# Altium schematic symbol library Capacitor - Aluminium TH.SchLib: 4591 symbols (part 20 of 27) (continued)
## UPJ1V102MHD (continued)
CAP ALUM 1000UF 20% 35V RADIAL; Part Number: UPJ1V102MHD; Manufacturer: Nichicon; TemperatureRange: -55C ~ 105C; Type: Polar; Ripple Current: 1.71A; Impedance: 35 mOhm; Value: 1000uF; PartId: 24222; Supplier 1: Digi-Key; Supplier Part Number 1: 493-11098-ND; ComponentLink1Description: Datasheet; ComponentLink1URL: http://nichicon-us.com/english/products/pdfs/e-upj.pdf; ComponentLink2Description: Digi-Key Listing; ComponentLink2URL: https://www.digikey.com/product-detail/en/nichicon/UPJ1V102MHD/493-11098-ND/2599303; Tolerance: 20%; Voltage: 35V; Price: 0.96; Device Package: Radial, Can, 12.5mm
footprint CAP AL TH D12.5 L5 H35.5
pins: 1, 2

## UPJ1V102MHD6TN
designator C?, comment 1000uF  (value not drawn)
CAP ALUM 1000UF 20% 35V RADIAL; Part Number: UPJ1V102MHD6TN; Manufacturer: Nichicon; TemperatureRange: -55C ~ 105C; Type: Polar; Ripple Current: 1.53A @ 120Hz; Impedance: 50 mOhm; Value: 1000uF; PartId: 26368; Supplier 1: Digi-Key; Supplier Part Number 1: 493-12242-3-ND; ComponentLink1Description: Datasheet; ComponentLink1URL: http://nichicon-us.com/english/products/pdfs/e-upj.pdf; ComponentLink2Description: Digi-Key Listing; ComponentLink2URL: https://www.digikey.com/product-detail/en/nichicon/UPJ1V102MHD6TN/493-12242-3-ND/4321385; Tolerance: 20%; Voltage: 35V; Price: 0.5706; Device Package: Radial, Can, 16mm
footprint CAP AL TH D16 L7.5 H22
pins: 1, 2

## UPJ1V121MPD6TD
designator C?, comment 120uF  (value not drawn)
CAP ALUM 120UF 20% 35V RADIAL; Part Number: UPJ1V121MPD6TD; Manufacturer: Nichicon; TemperatureRange: -55C ~ 105C; Type: Polar; Ripple Current: 375mA @ 120Hz; Impedance: 240 mOhm; Value: 120uF; PartId: 24773; Supplier 1: Digi-Key; Supplier Part Number 1: 493-11651-1-ND; ComponentLink1Description: Datasheet; ComponentLink1URL: http://nichicon-us.com/english/products/pdfs/e-upj.pdf; ComponentLink2Description: Digi-Key Listing; ComponentLink2URL: https://www.digikey.com/product-detail/en/nichicon/UPJ1V121MPD6TD/493-11651-1-ND/4319488; Tolerance: 20%; Voltage: 35V; Price: 0.43; Device Package: Radial, Can, 10mm
footprint CAP AL TH D10 L5 H14.5
pins: 1, 2

## UPJ1V151MPD6TD
designator C?, comment 150uF  (value not drawn)
CAP ALUM 150UF 20% 35V RADIAL; Part Number: UPJ1V151MPD6TD; Manufacturer: Nichicon; TemperatureRange: -55C ~ 105C; Type: Polar; Ripple Current: 435mA @ 120Hz; Impedance: 200 mOhm; Value: 150uF; PartId: 24868; Supplier 1: Digi-Key; Supplier Part Number 1: 493-11683-1-ND; ComponentLink1Description: Datasheet; ComponentLink1URL: http://nichicon-us.com/english/products/pdfs/e-upj.pdf; ComponentLink2Description: Digi-Key Listing; ComponentLink2URL: https://www.digikey.com/product-detail/en/nichicon/UPJ1V151MPD6TD/493-11683-1-ND/4319490; Tolerance: 20%; Voltage: 35V; Price: 0.47; Device Package: Radial, Can, 10mm
footprint CAP AL TH D10 L5 H14.5
pins: 1, 2

## UPJ1V181MPD6TD
designator C?, comment 180uF  (value not drawn)
CAP ALUM 180UF 20% 35V RADIAL; Part Number: UPJ1V181MPD6TD; Manufacturer: Nichicon; TemperatureRange: -55C ~ 105C; Type: Polar; Ripple Current: 500mA @ 120Hz; Impedance: 180 mOhm; Value: 180uF; PartId: 24998; Supplier 1: Digi-Key; Supplier Part Number 1: 493-5112-3-ND; ComponentLink1Description: Datasheet; ComponentLink1URL: http://nichicon-us.com/english/products/pdfs/e-upj.pdf; ComponentLink2Description: Digi-Key Listing; ComponentLink2URL: https://www.digikey.com/product-detail/en/nichicon/UPJ1V181MPD6TD/493-5112-3-ND/3130117; Tolerance: 20%; Voltage: 35V; Price: 0.1467; Device Package: Radial, Can, 10mm
footprint CAP AL TH D10 L5 H17.5
pins: 1, 2

## UPJ1V182MHD
designator C?, comment 1800uF  (value not drawn)
CAP ALUM 1800UF 20% 35V RADIAL; Part Number: UPJ1V182MHD; Manufacturer: Nichicon; TemperatureRange: -55C ~ 105C; Type: Polar; Ripple Current: 2.22A @ 120Hz; Impedance: 27 mOhm; Value: 1800uF; PartId: 27009; Supplier 1: Digi-Key; Supplier Part Number 1: 493-5560-ND; ComponentLink1Description: Datasheet; ComponentLink1URL: http://nichicon-us.com/english/products/pdfs/e-upj.pdf; ComponentLink2Description: Digi-Key Listing; ComponentLink2URL: https://www.digikey.com/product-detail/en/nichicon/UPJ1V182MHD/493-5560-ND/2599315; Tolerance: 20%; Voltage: 35V; Price: 1.4; Device Package: Radial, Can, 16mm
footprint CAP AL TH D16 L7.5 H33.5
pins: 1, 2

## UPJ1V221MPD6
designator C?, comment 220uF  (value not drawn)
CAP ALUM 220UF 20% 35V RADIAL; Part Number: UPJ1V221MPD6; Manufacturer: Nichicon; TemperatureRange: -55C ~ 105C; Type: Polar; Ripple Current: 560mA @ 120Hz; Impedance: 140 mOhm; Value: 220uF; PartId: 25182; Supplier 1: Digi-Key; Supplier Part Number 1: UPJ1V221MPD6-ND; ComponentLink1Description: Datasheet; ComponentLink1URL: http://nichicon-us.com/english/products/pdfs/e-upj.pdf; ComponentLink2Description: Digi-Key Listing; ComponentLink2URL: https://www.digikey.com/product-detail/en/nichicon/UPJ1V221MPD6/UPJ1V221MPD6-ND/2428095; Tolerance: 20%; Voltage: 35V; Price: 0.47; Device Package: Radial, Can, 10mm
footprint CAP AL TH D10 L5 H17.5
pins: 1, 2

## UPJ1V222MHD
designator C?, comment 2200uF  (value not drawn)
CAP ALUM 2200UF 20% 35V RADIAL; Part Number: UPJ1V222MHD; Manufacturer: Nichicon; TemperatureRange: -55C ~ 105C; Type: Polar; Ripple Current: 2.41A @ 120Hz; Impedance: 24 mOhm; Value: 2200uF; PartId: 27342; Supplier 1: Digi-Key; Supplier Part Number 1: 493-5561-ND; ComponentLink1Description: Datasheet; ComponentLink1URL: http://nichicon-us.com/english/products/pdfs/e-upj.pdf; ComponentLink2Description: Digi-Key Listing; ComponentLink2URL: https://www.digikey.com/product-detail/en/nichicon/UPJ1V222MHD/493-5561-ND/2599319; Tolerance: 20%; Voltage: 35V; Price: 1.67; Device Package: Radial, Can, 16mm
footprint CAP AL TH D16 L7.5 H37
pins: 1, 2

## UPJ1V271MHD6TO
designator C?, comment 270uF  (value not drawn)
CAP ALUM 270UF 20% 35V RADIAL; Part Number: UPJ1V271MHD6TO; Manufacturer: Nichicon; TemperatureRange: -55C ~ 105C; Type: Polar; Ripple Current: 690mA @ 120Hz; Impedance: 130 mOhm; Value: 270uF; PartId: 22732; Supplier 1: Digi-Key; Supplier Part Number 1: 493-5116-1-ND; ComponentLink1Description: Datasheet; ComponentLink1URL: http://nichicon-us.com/english/products/pdfs/e-upj.pdf; ComponentLink2Description: Digi-Key Listing; ComponentLink2URL: https://www.digikey.com/product-detail/en/nichicon/UPJ1V271MHD6TO/493-5116-1-ND/3129453; Tolerance: 20%; Voltage: 35V; Price: 0; Device Package: Radial, Can, 12.5mm
footprint CAP AL TH D12.5 L5 H16.5
pins: 1, 2

## UPJ1V271MPD1TD
designator C?, comment 270uF  (value not drawn)
CAP ALUM 270UF 20% 35V RADIAL; Part Number: UPJ1V271MPD1TD; Manufacturer: Nichicon; TemperatureRange: -55C ~ 105C; Type: Polar; Ripple Current: 735mA @ 120Hz; Impedance: 110 mOhm; Value: 270uF; PartId: 25451; Supplier 1: Digi-Key; Supplier Part Number 1: 493-5117-3-ND; ComponentLink1Description: Datasheet; ComponentLink1URL: http://nichicon-us.com/english/products/pdfs/e-upj.pdf; ComponentLink2Description: Digi-Key Listing; ComponentLink2URL: https://www.digikey.com/product-detail/en/nichicon/UPJ1V271MPD1TD/493-5117-3-ND/3130122; Tolerance: 20%; Voltage: 35V; Price: 0.1708; Device Package: Radial, Can, 10mm
footprint CAP AL TH D10 L5 H22
pins: 1, 2

## UPJ1V331MHD6TO
designator C?, comment 330uF  (value not drawn)
CAP ALUM 330UF 20% 35V RADIAL; Part Number: UPJ1V331MHD6TO; Manufacturer: Nichicon; TemperatureRange: -55C ~ 105C; Type: Polar; Ripple Current: 780mA @ 120Hz; Impedance: 100 mOhm; Value: 330uF; PartId: 22747; Supplier 1: Digi-Key; Supplier Part Number 1: 493-5119-1-ND; ComponentLink1Description: Datasheet; ComponentLink1URL: http://nichicon-us.com/english/products/pdfs/e-upj.pdf; ComponentLink2Description: Digi-Key Listing; ComponentLink2URL: https://www.digikey.com/product-detail/en/nichicon/UPJ1V331MHD6TO/493-5119-1-ND/3129456; Tolerance: 20%; Voltage: 35V; Price: 0; Device Package: Radial, Can, 12.5mm
footprint CAP AL TH D12.5 L5 H16.5
pins: 1, 2

## UPJ1V331MPD1TD
designator C?, comment 330uF  (value not drawn)
CAP ALUM 330UF 20% 35V RADIAL; Part Number: UPJ1V331MPD1TD; Manufacturer: Nichicon; TemperatureRange: -55C ~ 105C; Type: Polar; Ripple Current: 810mA @ 120Hz; Impedance: 96 mOhm; Value: 330uF; PartId: 25453; Supplier 1: Digi-Key; Supplier Part Number 1: 493-5120-3-ND; ComponentLink1Description: Datasheet; ComponentLink1URL: http://nichicon-us.com/english/products/pdfs/e-upj.pdf; ComponentLink2Description: Digi-Key Listing; ComponentLink2URL: https://www.digikey.com/product-detail/en/nichicon/UPJ1V331MPD1TD/493-5120-3-ND/3130125; Tolerance: 20%; Voltage: 35V; Price: 0.1742; Device Package: Radial, Can, 10mm
footprint CAP AL TH D10 L5 H22
pins: 1, 2

## UPJ1V391MHD6TO
designator C?, comment 390uF  (value not drawn)
CAP ALUM 390UF 20% 35V RADIAL; Part Number: UPJ1V391MHD6TO; Manufacturer: Nichicon; TemperatureRange: -55C ~ 105C; Type: Polar; Ripple Current: 825mA @ 120Hz; Impedance: 96 mOhm; Value: 390uF; PartId: 22745; Supplier 1: Digi-Key; Supplier Part Number 1: 493-5122-1-ND; ComponentLink1Description: Datasheet; ComponentLink1URL: http://nichicon-us.com/english/products/pdfs/e-upj.pdf; ComponentLink2Description: Digi-Key Listing; ComponentLink2URL: https://www.digikey.com/product-detail/en/nichicon/UPJ1V391MHD6TO/493-5122-1-ND/3129459; Tolerance: 20%; Voltage: 35V; Price: 0; Device Package: Radial, Can, 12.5mm
footprint CAP AL TH D12.5 L5 H16.5
pins: 1, 2

## UPJ1V391MPD1TD
designator C?, comment 390uF  (value not drawn)
CAP ALUM 390UF 20% 35V RADIAL; Part Number: UPJ1V391MPD1TD; Manufacturer: Nichicon; TemperatureRange: -55C ~ 105C; Type: Polar; Ripple Current: 955mA @ 120Hz; Impedance: 84 mOhm; Value: 390uF; PartId: 26003; Supplier 1: Digi-Key; Supplier Part Number 1: 493-5123-3-ND; ComponentLink1Description: Datasheet; ComponentLink1URL: http://nichicon-us.com/english/products/pdfs/e-upj.pdf; ComponentLink2Description: Digi-Key Listing; ComponentLink2URL: https://www.digikey.com/product-detail/en/nichicon/UPJ1V391MPD1TD/493-5123-3-ND/3130128; Tolerance: 20%; Voltage: 35V; Price: 0.2282; Device Package: Radial, Can, 10mm
footprint CAP AL TH D10 L5 H30
pins: 1, 2

## UPJ1V471MHD6TN
designator C?, comment 470uF  (value not drawn)
CAP ALUM 470UF 20% 35V RADIAL; Part Number: UPJ1V471MHD6TN; Manufacturer: Nichicon; TemperatureRange: -55C ~ 105C; Type: Polar; Ripple Current: 1.01A @ 120Hz; Impedance: 84 mOhm; Value: 470uF; PartId: 26238; Supplier 1: Digi-Key; Supplier Part Number 1: 493-12125-3-ND; ComponentLink1Description: Datasheet; ComponentLink1URL: http://nichicon-us.com/english/products/pdfs/e-upj.pdf; ComponentLink2Description: Digi-Key Listing; ComponentLink2URL: https://www.digikey.com/product-detail/en/nichicon/UPJ1V471MHD6TN/493-12125-3-ND/4321268; Tolerance: 20%; Voltage: 35V; Price: 0.4441; Device Package: Radial, Can, 16mm
footprint CAP AL TH D16 L7.5 H16.5
pins: 1, 2

## UPJ1V561MHD
designator C?, comment 560uF  (value not drawn)
CAP ALUM 560UF 20% 35V RADIAL; Part Number: UPJ1V561MHD; Manufacturer: Nichicon; TemperatureRange: -55C ~ 105C; Type: Polar; Ripple Current: 1.16A @ 120Hz; Impedance: 59 mOhm; Value: 560uF; PartId: 22852; Supplier 1: Digi-Key; Supplier Part Number 1: UPJ1V561MHD-ND; ComponentLink1Description: Datasheet; ComponentLink1URL: http://nichicon-us.com/english/products/pdfs/e-upj.pdf; ComponentLink2Description: Digi-Key Listing; ComponentLink2URL: https://www.digikey.com/product-detail/en/nichicon/UPJ1V561MHD/UPJ1V561MHD-ND/2428093; Tolerance: 20%; Voltage: 35V; Price: 0; Device Package: Radial, Can, 12.5mm
footprint CAP AL TH D12.5 L5 H20
pins: 1, 2

## UPJ1V561MHD1TO
designator C?, comment 560uF  (value not drawn)
CAP ALUM 560UF 20% 35V RADIAL; Part Number: UPJ1V561MHD1TO; Manufacturer: Nichicon; TemperatureRange: -55C ~ 105C; Type: Polar; Ripple Current: 1.16A @ 120Hz; Impedance: 59 mOhm; Value: 560uF; PartId: 23271; Supplier 1: Digi-Key; Supplier Part Number 1: 493-11997-1-ND; ComponentLink1Description: Datasheet; ComponentLink1URL: http://nichicon-us.com/english/products/pdfs/e-upj.pdf; ComponentLink2Description: Digi-Key Listing; ComponentLink2URL: https://www.digikey.com/product-detail/en/nichicon/UPJ1V561MHD1TO/493-11997-1-ND/4319496; Tolerance: 20%; Voltage: 35V; Price: 0.75; Device Package: Radial, Can, 12.5mm
footprint CAP AL TH D12.5 L5 H22
pins: 1, 2

## UPJ1V681MHD1TO
designator C?, comment 680uF  (value not drawn)
CAP ALUM 680UF 20% 35V RADIAL; Part Number: UPJ1V681MHD1TO; Manufacturer: Nichicon; TemperatureRange: -55C ~ 105C; Type: Polar; Ripple Current: 1.37A @ 120Hz; Impedance: 48 mOhm; Value: 680uF; PartId: 23628; Supplier 1: Digi-Key; Supplier Part Number 1: 493-5126-3-ND; ComponentLink1Description: Datasheet; ComponentLink1URL: http://nichicon-us.com/english/products/pdfs/e-upj.pdf; ComponentLink2Description: Digi-Key Listing; ComponentLink2URL: https://www.digikey.com/product-detail/en/nichicon/UPJ1V681MHD1TO/493-5126-3-ND/3130131; Tolerance: 20%; Voltage: 35V; Price: 0.3506; Device Package: Radial, Can, 12.5mm
footprint CAP AL TH D12.5 L5 H26.5
pins: 1, 2

## UPJ1V821MHD1TO
designator C?, comment 820uF  (value not drawn)
CAP ALUM 820UF 20% 35V RADIAL; Part Number: UPJ1V821MHD1TO; Manufacturer: Nichicon; TemperatureRange: -55C ~ 105C; Type: Polar; Ripple Current: 1.49A @ 120Hz; Impedance: 42 mOhm; Value: 820uF; PartId: 24006; Supplier 1: Digi-Key; Supplier Part Number 1: 493-12139-1-ND; ComponentLink1Description: Datasheet; ComponentLink1URL: http://nichicon-us.com/english/products/pdfs/e-upj.pdf; ComponentLink2Description: Digi-Key Listing; ComponentLink2URL: https://www.digikey.com/product-detail/en/nichicon/UPJ1V821MHD1TO/493-12139-1-ND/4319499; Tolerance: 20%; Voltage: 35V; Price: 1.05; Device Package: Radial, Can, 12.5mm
footprint CAP AL TH D12.5 L5 H27
pins: 1, 2

## UPJ2A101MHD6TN
designator C?, comment 100uF  (value not drawn)
CAP ALUM 100UF 20% 100V RADIAL; Part Number: UPJ2A101MHD6TN; Manufacturer: Nichicon; TemperatureRange: -55C ~ 105C; Type: Polar; Ripple Current: 475mA @ 120Hz; Impedance: 170 mOhm; Value: 100uF; PartId: 26253; Supplier 1: Digi-Key; Supplier Part Number 1: 493-12211-3-ND; ComponentLink1Description: Datasheet; ComponentLink1URL: http://nichicon-us.com/english/products/pdfs/e-upj.pdf; ComponentLink2Description: Digi-Key Listing; ComponentLink2URL: https://www.digikey.com/product-detail/en/nichicon/UPJ2A101MHD6TN/493-12211-3-ND/4321354; Tolerance: 20%; Voltage: 100V; Price: 0.5412; Device Package: Radial, Can, 16mm
footprint CAP AL TH D16 L7.5 H16.5
pins: 1, 2

## UPJ2A121MHD
designator C?, comment 120uF  (value not drawn)
CAP ALUM 120UF 20% 100V RADIAL; Part Number: UPJ2A121MHD; Manufacturer: Nichicon; TemperatureRange: -55C ~ 105C; Type: Polar; Ripple Current: 519mA @ 120Hz; Impedance: 130 mOhm; Value: 120uF; PartId: 23545; Supplier 1: Digi-Key; Supplier Part Number 1: UPJ2A121MHD-ND; ComponentLink1Description: Datasheet; ComponentLink1URL: http://nichicon-us.com/english/products/pdfs/e-upj.pdf; ComponentLink2Description: Digi-Key Listing; ComponentLink2URL: https://www.digikey.com/product-detail/en/nichicon/UPJ2A121MHD/UPJ2A121MHD-ND/2428092; Tolerance: 20%; Voltage: 100V; Price: 0.83; Device Package: Radial, Can, 12.5mm
footprint CAP AL TH D12.5 L5 H25
pins: 1, 2

## UPJ2A121MHD1TO
designator C?, comment 120uF  (value not drawn)
CAP ALUM 120UF 20% 100V RADIAL; Part Number: UPJ2A121MHD1TO; Manufacturer: Nichicon; TemperatureRange: -55C ~ 105C; Type: Polar; Ripple Current: 519mA @ 120Hz; Impedance: 130 mOhm; Value: 120uF; PartId: 23797; Supplier 1: Digi-Key; Supplier Part Number 1: 493-12065-3-ND; ComponentLink1Description: Datasheet; ComponentLink1URL: http://nichicon-us.com/english/products/pdfs/e-upj.pdf; ComponentLink2Description: Digi-Key Listing; ComponentLink2URL: https://www.digikey.com/product-detail/en/nichicon/UPJ2A121MHD1TO/493-12065-3-ND/4321208; Tolerance: 20%; Voltage: 100V; Price: 0.3315; Device Package: Radial, Can, 12.5mm
footprint CAP AL TH D12.5 L5 H27
pins: 1, 2

## UPJ2A151MHD1TO
designator C?, comment 150uF  (value not drawn)
CAP ALUM 150UF 20% 100V RADIAL; Part Number: UPJ2A151MHD1TO; Manufacturer: Nichicon; TemperatureRange: -55C ~ 105C; Type: Polar; Ripple Current: 553mA @ 120Hz; Impedance: 110 mOhm; Value: 150uF; PartId: 23629; Supplier 1: Digi-Key; Supplier Part Number 1: 493-5129-3-ND; ComponentLink1Description: Datasheet; ComponentLink1URL: http://nichicon-us.com/english/products/pdfs/e-upj.pdf; ComponentLink2Description: Digi-Key Listing; ComponentLink2URL: https://www.digikey.com/product-detail/en/nichicon/UPJ2A151MHD1TO/493-5129-3-ND/3130134; Tolerance: 20%; Voltage: 100V; Price: 0.3549; Device Package: Radial, Can, 12.5mm
footprint CAP AL TH D12.5 L5 H26.5
pins: 1, 2

## UPJ2A181MHD
designator C?, comment 180uF  (value not drawn)
CAP ALUM 180UF 20% 100V RADIAL; Part Number: UPJ2A181MHD; Manufacturer: Nichicon; TemperatureRange: -55C ~ 105C; Type: Polar; Ripple Current: 641mA @ 120Hz; Impedance: 98 mOhm; Value: 180uF; PartId: 24210; Supplier 1: Digi-Key; Supplier Part Number 1: 493-5564-ND; ComponentLink1Description: Datasheet; ComponentLink1URL: http://nichicon-us.com/english/products/pdfs/e-upj.pdf; ComponentLink2Description: Digi-Key Listing; ComponentLink2URL: https://www.digikey.com/product-detail/en/nichicon/UPJ2A181MHD/493-5564-ND/2599353; Tolerance: 20%; Voltage: 100V; Price: 0.93; Device Package: Radial, Can, 12.5mm
footprint CAP AL TH D12.5 L5 H35.5
pins: 1, 2

## UPJ2A270MPD6TD
designator C?, comment 27uF  (value not drawn)
CAP ALUM 27UF 20% 100V RADIAL; Part Number: UPJ2A270MPD6TD; Manufacturer: Nichicon; TemperatureRange: -55C ~ 105C; Type: Polar; Ripple Current: 145mA @ 120Hz; Impedance: 500 mOhm; Value: 27uF; PartId: 24551; Supplier 1: Digi-Key; Supplier Part Number 1: 493-5132-3-ND; ComponentLink1Description: Datasheet; ComponentLink1URL: http://nichicon-us.com/english/products/pdfs/e-upj.pdf; ComponentLink2Description: Digi-Key Listing; ComponentLink2URL: https://www.digikey.com/product-detail/en/nichicon/UPJ2A270MPD6TD/493-5132-3-ND/3130137; Tolerance: 20%; Voltage: 100V; Price: 0.1496; Device Package: Radial, Can, 10mm
footprint CAP AL TH D10 L5 H14.5
pins: 1, 2

## UPJ2A330MPD6TD
designator C?, comment 33uF  (value not drawn)
CAP ALUM 33UF 20% 100V RADIAL; Part Number: UPJ2A330MPD6TD; Manufacturer: Nichicon; TemperatureRange: -55C ~ 105C; Type: Polar; Ripple Current: 166mA @ 120Hz; Impedance: 420 mOhm; Value: 33uF; PartId: 24606; Supplier 1: Digi-Key; Supplier Part Number 1: 493-11883-3-ND; ComponentLink1Description: Datasheet; ComponentLink1URL: http://nichicon-us.com/english/products/pdfs/e-upj.pdf; ComponentLink2Description: Digi-Key Listing; ComponentLink2URL: https://www.digikey.com/product-detail/en/nichicon/UPJ2A330MPD6TD/493-11883-3-ND/4321026; Tolerance: 20%; Voltage: 100V; Price: 0.183; Device Package: Radial, Can, 10mm
footprint CAP AL TH D10 L5 H14.5
pins: 1, 2

## UPJ2A331MHD
designator C?, comment 330uF  (value not drawn)
CAP ALUM 330UF 20% 100V RADIAL; Part Number: UPJ2A331MHD; Manufacturer: Nichicon; TemperatureRange: -55C ~ 105C; Type: Polar; Ripple Current: 1.16A; Impedance: 62 mOhm; Value: 330uF; PartId: 26989; Supplier 1: Digi-Key; Supplier Part Number 1: 493-11104-ND; ComponentLink1Description: Datasheet; ComponentLink1URL: http://nichicon-us.com/english/products/pdfs/e-upj.pdf; ComponentLink2Description: Digi-Key Listing; ComponentLink2URL: https://www.digikey.com/product-detail/en/nichicon/UPJ2A331MHD/493-11104-ND/2599366; Tolerance: 20%; Voltage: 100V; Price: 1.27; Device Package: Radial, Can, 16mm
footprint CAP AL TH D16 L7.5 H33.5
pins: 1, 2

## UPJ2A390MPD6TD
designator C?, comment 39uF  (value not drawn)
CAP ALUM 39UF 20% 100V RADIAL; Part Number: UPJ2A390MPD6TD; Manufacturer: Nichicon; TemperatureRange: -55C ~ 105C; Type: Polar; Ripple Current: 193mA @ 120Hz; Impedance: 360 mOhm; Value: 39uF; PartId: 25045; Supplier 1: Digi-Key; Supplier Part Number 1: 493-5135-3-ND; ComponentLink1Description: Datasheet; ComponentLink1URL: http://nichicon-us.com/english/products/pdfs/e-upj.pdf; ComponentLink2Description: Digi-Key Listing; ComponentLink2URL: https://www.digikey.com/product-detail/en/nichicon/UPJ2A390MPD6TD/493-5135-3-ND/3130140; Tolerance: 20%; Voltage: 100V; Price: 0.1936; Device Package: Radial, Can, 10mm
footprint CAP AL TH D10 L5 H17.5
pins: 1, 2

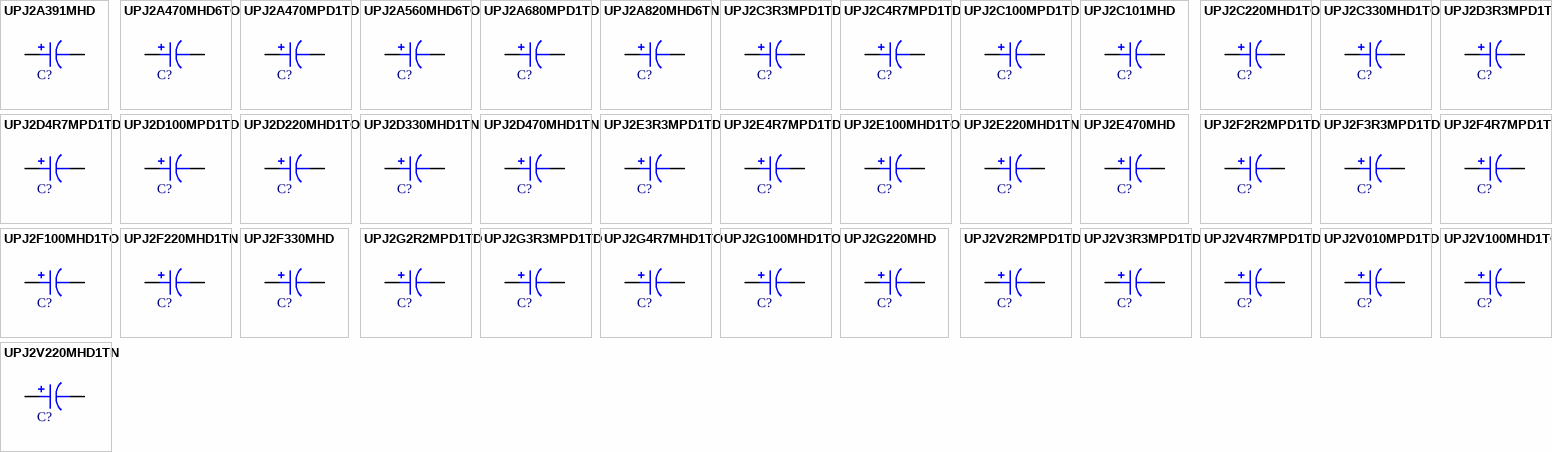
[diagram p84: symbols UPJ2A391MHD to UPJ2V220MHD1TN]

## UPJ2A391MHD
designator C?, comment 390uF  (value not drawn)
CAP ALUM 390UF 20% 100V RADIAL; Part Number: UPJ2A391MHD; Manufacturer: Nichicon; TemperatureRange: -55C ~ 105C; Type: Polar; Ripple Current: 1.34A @ 120Hz; Impedance: 53 mOhm; Value: 390uF; PartId: 27324; Supplier 1: Digi-Key; Supplier Part Number 1: 493-5566-ND; ComponentLink1Description: Datasheet; ComponentLink1URL: http://nichicon-us.com/english/products/pdfs/e-upj.pdf; ComponentLink2Description: Digi-Key Listing; ComponentLink2URL: https://www.digikey.com/product-detail/en/nichicon/UPJ2A391MHD/493-5566-ND/2599370; Tolerance: 20%; Voltage: 100V; Price: 1.54; Device Package: Radial, Can, 16mm
footprint CAP AL TH D16 L7.5 H37
pins: 1, 2

## UPJ2A470MHD6TO
designator C?, comment 47uF  (value not drawn)
CAP ALUM 47UF 20% 100V RADIAL; Part Number: UPJ2A470MHD6TO; Manufacturer: Nichicon; TemperatureRange: -55C ~ 105C; Type: Polar; Ripple Current: 239mA @ 120Hz; Impedance: 310 mOhm; Value: 47uF; PartId: 22743; Supplier 1: Digi-Key; Supplier Part Number 1: 493-5137-1-ND; ComponentLink1Description: Datasheet; ComponentLink1URL: http://nichicon-us.com/english/products/pdfs/e-upj.pdf; ComponentLink2Description: Digi-Key Listing; ComponentLink2URL: https://www.digikey.com/product-detail/en/nichicon/UPJ2A470MHD6TO/493-5137-1-ND/3129474; Tolerance: 20%; Voltage: 100V; Price: 0; Device Package: Radial, Can, 12.5mm
footprint CAP AL TH D12.5 L5 H16.5
pins: 1, 2

## UPJ2A470MPD1TD
designator C?, comment 47uF  (value not drawn)
CAP ALUM 47UF 20% 100V RADIAL; Part Number: UPJ2A470MPD1TD; Manufacturer: Nichicon; TemperatureRange: -55C ~ 105C; Type: Polar; Ripple Current: 252mA @ 120Hz; Impedance: 280 mOhm; Value: 47uF; PartId: 25748; Supplier 1: Digi-Key; Supplier Part Number 1: 493-11915-3-ND; ComponentLink1Description: Datasheet; ComponentLink1URL: http://nichicon-us.com/english/products/pdfs/e-upj.pdf; ComponentLink2Description: Digi-Key Listing; ComponentLink2URL: https://www.digikey.com/product-detail/en/nichicon/UPJ2A470MPD1TD/493-11915-3-ND/4321058; Tolerance: 20%; Voltage: 100V; Price: 0.2004; Device Package: Radial, Can, 10mm
footprint CAP AL TH D10 L5 H22
pins: 1, 2

## UPJ2A560MHD6TO
designator C?, comment 56uF  (value not drawn)
CAP ALUM 56UF 20% 100V RADIAL; Part Number: UPJ2A560MHD6TO; Manufacturer: Nichicon; TemperatureRange: -55C ~ 105C; Type: Polar; Ripple Current: 258mA @ 120Hz; Impedance: 270 mOhm; Value: 56uF; PartId: 22744; Supplier 1: Digi-Key; Supplier Part Number 1: 493-5139-1-ND; ComponentLink1Description: Datasheet; ComponentLink1URL: http://nichicon-us.com/english/products/pdfs/e-upj.pdf; ComponentLink2Description: Digi-Key Listing; ComponentLink2URL: https://www.digikey.com/product-detail/en/nichicon/UPJ2A560MHD6TO/493-5139-1-ND/3129476; Tolerance: 20%; Voltage: 100V; Price: 0; Device Package: Radial, Can, 12.5mm
footprint CAP AL TH D12.5 L5 H16.5
pins: 1, 2

## UPJ2A680MPD1TD
designator C?, comment 68uF  (value not drawn)
CAP ALUM 68UF 20% 100V RADIAL; Part Number: UPJ2A680MPD1TD; Manufacturer: Nichicon; TemperatureRange: -55C ~ 105C; Type: Polar; Ripple Current: 326mA @ 120Hz; Impedance: 210 mOhm; Value: 68uF; PartId: 26014; Supplier 1: Digi-Key; Supplier Part Number 1: 493-5140-3-ND; ComponentLink1Description: Datasheet; ComponentLink1URL: http://nichicon-us.com/english/products/pdfs/e-upj.pdf; ComponentLink2Description: Digi-Key Listing; ComponentLink2URL: https://www.digikey.com/product-detail/en/nichicon/UPJ2A680MPD1TD/493-5140-3-ND/3130145; Tolerance: 20%; Voltage: 100V; Price: 0.3068; Device Package: Radial, Can, 10mm
footprint CAP AL TH D10 L5 H30
pins: 1, 2

## UPJ2A820MHD6TN
designator C?, comment 82uF  (value not drawn)
CAP ALUM 82UF 20% 100V RADIAL; Part Number: UPJ2A820MHD6TN; Manufacturer: Nichicon; TemperatureRange: -55C ~ 105C; Type: Polar; Ripple Current: 433mA @ 120Hz; Impedance: 190 mOhm; Value: 82uF; PartId: 26250; Supplier 1: Digi-Key; Supplier Part Number 1: 493-5142-3-ND; ComponentLink1Description: Datasheet; ComponentLink1URL: http://nichicon-us.com/english/products/pdfs/e-upj.pdf; ComponentLink2Description: Digi-Key Listing; ComponentLink2URL: https://www.digikey.com/product-detail/en/nichicon/UPJ2A820MHD6TN/493-5142-3-ND/3130147; Tolerance: 20%; Voltage: 100V; Price: 0.5226; Device Package: Radial, Can, 16mm
footprint CAP AL TH D16 L7.5 H16.5
pins: 1, 2

## UPJ2C3R3MPD1TD
designator C?, comment 3.3uF  (value not drawn)
CAP ALUM 3.3UF 20% 160V RADIAL; Part Number: UPJ2C3R3MPD1TD; Manufacturer: Nichicon; TemperatureRange: -40C ~ 105C; Type: Polar; Ripple Current: 50mA @ 120Hz; Value: 3.3uF; PartId: 24589; Supplier 1: Digi-Key; Supplier Part Number 1: 493-5147-3-ND; ComponentLink1Description: Datasheet; ComponentLink1URL: http://nichicon-us.com/english/products/pdfs/e-upj.pdf; ComponentLink2Description: Digi-Key Listing; ComponentLink2URL: https://www.digikey.com/product-detail/en/nichicon/UPJ2C3R3MPD1TD/493-5147-3-ND/3130152; Tolerance: 20%; Voltage: 160V; Price: 0.1712; Device Package: Radial, Can, 10mm
footprint CAP AL TH D10 L5 H14.5
pins: 1, 2

## UPJ2C4R7MPD1TD
designator C?, comment 4.7uF  (value not drawn)
CAP ALUM 4.7UF 20% 160V RADIAL; Part Number: UPJ2C4R7MPD1TD; Manufacturer: Nichicon; TemperatureRange: -40C ~ 105C; Type: Polar; Ripple Current: 57mA @ 120Hz; Value: 4.7uF; PartId: 24590; Supplier 1: Digi-Key; Supplier Part Number 1: 493-11862-3-ND; ComponentLink1Description: Datasheet; ComponentLink1URL: http://nichicon-us.com/english/products/pdfs/e-upj.pdf; ComponentLink2Description: Digi-Key Listing; ComponentLink2URL: https://www.digikey.com/product-detail/en/nichicon/UPJ2C4R7MPD1TD/493-11862-3-ND/4321005; Tolerance: 20%; Voltage: 160V; Price: 0.1718; Device Package: Radial, Can, 10mm
footprint CAP AL TH D10 L5 H14.5
pins: 1, 2

## UPJ2C100MPD1TD
designator C?, comment 10uF  (value not drawn)
CAP ALUM 10UF 20% 160V RADIAL; Part Number: UPJ2C100MPD1TD; Manufacturer: Nichicon; TemperatureRange: -40C ~ 105C; Type: Polar; Ripple Current: 90mA @ 120Hz; Value: 10uF; PartId: 25076; Supplier 1: Digi-Key; Supplier Part Number 1: 493-5146-3-ND; ComponentLink1Description: Datasheet; ComponentLink1URL: http://nichicon-us.com/english/products/pdfs/e-upj.pdf; ComponentLink2Description: Digi-Key Listing; ComponentLink2URL: https://www.digikey.com/product-detail/en/nichicon/UPJ2C100MPD1TD/493-5146-3-ND/3130151; Tolerance: 20%; Voltage: 160V; Price: 0.232; Device Package: Radial, Can, 10mm
footprint CAP AL TH D10 L5 H17.5
pins: 1, 2

## UPJ2C101MHD
designator C?, comment 100uF  (value not drawn)
CAP ALUM 100UF 20% 160V RADIAL; Part Number: UPJ2C101MHD; Manufacturer: Nichicon; TemperatureRange: -40C ~ 105C; Type: Polar; Ripple Current: 330mA @ 120Hz; Value: 100uF; PartId: 27328; Supplier 1: Digi-Key; Supplier Part Number 1: 493-5569-ND; ComponentLink1Description: Datasheet; ComponentLink1URL: http://nichicon-us.com/english/products/pdfs/e-upj.pdf; ComponentLink2Description: Digi-Key Listing; ComponentLink2URL: https://www.digikey.com/product-detail/en/nichicon/UPJ2C101MHD/493-5569-ND/2599390; Tolerance: 20%; Voltage: 160V; Price: 1.58; Device Package: Radial, Can, 16mm
footprint CAP AL TH D16 L7.5 H37
pins: 1, 2

## UPJ2C220MHD1TO
designator C?, comment 22uF  (value not drawn)
CAP ALUM 22UF 20% 160V RADIAL; Part Number: UPJ2C220MHD1TO; Manufacturer: Nichicon; TemperatureRange: -40C ~ 105C; Type: Polar; Ripple Current: 140mA @ 120Hz; Value: 22uF; PartId: 23159; Supplier 1: Digi-Key; Supplier Part Number 1: 493-12074-3-ND; ComponentLink1Description: Datasheet; ComponentLink1URL: http://nichicon-us.com/english/products/pdfs/e-upj.pdf; ComponentLink2Description: Digi-Key Listing; ComponentLink2URL: https://www.digikey.com/product-detail/en/nichicon/UPJ2C220MHD1TO/493-12074-3-ND/4321217; Tolerance: 20%; Voltage: 160V; Price: 0.3258; Device Package: Radial, Can, 12.5mm
footprint CAP AL TH D12.5 L5 H22
pins: 1, 2

## UPJ2C330MHD1TO
designator C?, comment 33uF  (value not drawn)
CAP ALUM 33UF 20% 160V RADIAL; Part Number: UPJ2C330MHD1TO; Manufacturer: Nichicon; TemperatureRange: -40C ~ 105C; Type: Polar; Ripple Current: 175mA @ 120Hz; Value: 33uF; PartId: 24067; Supplier 1: Digi-Key; Supplier Part Number 1: 493-12226-1-ND; ComponentLink1Description: Datasheet; ComponentLink1URL: http://nichicon-us.com/english/products/pdfs/e-upj.pdf; ComponentLink2Description: Digi-Key Listing; ComponentLink2URL: https://www.digikey.com/product-detail/en/nichicon/UPJ2C330MHD1TO/493-12226-1-ND/4319521; Tolerance: 20%; Voltage: 160V; Price: 1.19; Device Package: Radial, Can, 12.5mm
footprint CAP AL TH D12.5 L5 H27
pins: 1, 2

## UPJ2D3R3MPD1TD
designator C?, comment 3.3uF  (value not drawn)
CAP ALUM 3.3UF 20% 200V RADIAL; Part Number: UPJ2D3R3MPD1TD; Manufacturer: Nichicon; TemperatureRange: -40C ~ 105C; Type: Polar; Ripple Current: 50mA @ 120Hz; Value: 3.3uF; PartId: 24591; Supplier 1: Digi-Key; Supplier Part Number 1: 493-5153-3-ND; ComponentLink1Description: Datasheet; ComponentLink1URL: http://nichicon-us.com/english/products/pdfs/e-upj.pdf; ComponentLink2Description: Digi-Key Listing; ComponentLink2URL: https://www.digikey.com/product-detail/en/nichicon/UPJ2D3R3MPD1TD/493-5153-3-ND/3130158; Tolerance: 20%; Voltage: 200V; Price: 0.1718; Device Package: Radial, Can, 10mm
footprint CAP AL TH D10 L5 H14.5
pins: 1, 2

## UPJ2D4R7MPD1TD
designator C?, comment 4.7uF  (value not drawn)
CAP ALUM 4.7UF 20% 200V RADIAL; Part Number: UPJ2D4R7MPD1TD; Manufacturer: Nichicon; TemperatureRange: -40C ~ 105C; Type: Polar; Ripple Current: 60mA @ 120Hz; Value: 4.7uF; PartId: 25074; Supplier 1: Digi-Key; Supplier Part Number 1: 493-5155-3-ND; ComponentLink1Description: Datasheet; ComponentLink1URL: http://nichicon-us.com/english/products/pdfs/e-upj.pdf; ComponentLink2Description: Digi-Key Listing; ComponentLink2URL: https://www.digikey.com/product-detail/en/nichicon/UPJ2D4R7MPD1TD/493-5155-3-ND/3130160; Tolerance: 20%; Voltage: 200V; Price: 0.232; Device Package: Radial, Can, 10mm
footprint CAP AL TH D10 L5 H17.5
pins: 1, 2

## UPJ2D100MPD1TD
designator C?, comment 10uF  (value not drawn)
CAP ALUM 10UF 20% 200V RADIAL; Part Number: UPJ2D100MPD1TD; Manufacturer: Nichicon; TemperatureRange: -40C ~ 105C; Type: Polar; Ripple Current: 95mA @ 120Hz; Value: 10uF; PartId: 25459; Supplier 1: Digi-Key; Supplier Part Number 1: 493-5149-3-ND; ComponentLink1Description: Datasheet; ComponentLink1URL: http://nichicon-us.com/english/products/pdfs/e-upj.pdf; ComponentLink2Description: Digi-Key Listing; ComponentLink2URL: https://www.digikey.com/product-detail/en/nichicon/UPJ2D100MPD1TD/493-5149-3-ND/3130154; Tolerance: 20%; Voltage: 200V; Price: 0.253; Device Package: Radial, Can, 10mm
footprint CAP AL TH D10 L5 H22
pins: 1, 2

## UPJ2D220MHD1TO
designator C?, comment 22uF  (value not drawn)